# Altium footprint library mfmc_footprints.PcbLib: 156 footprints (part 1 of 10)
Each footprint in its own frame and in the unit in brackets; x right, y up, seen from the top. Pads: shape width x height; smd on the part's side, far side on the other; paste and mask are expansions set on the pad; w line width, h text height; cw(c..) or ccw(c..) is an arc to the next point about the centre after c.
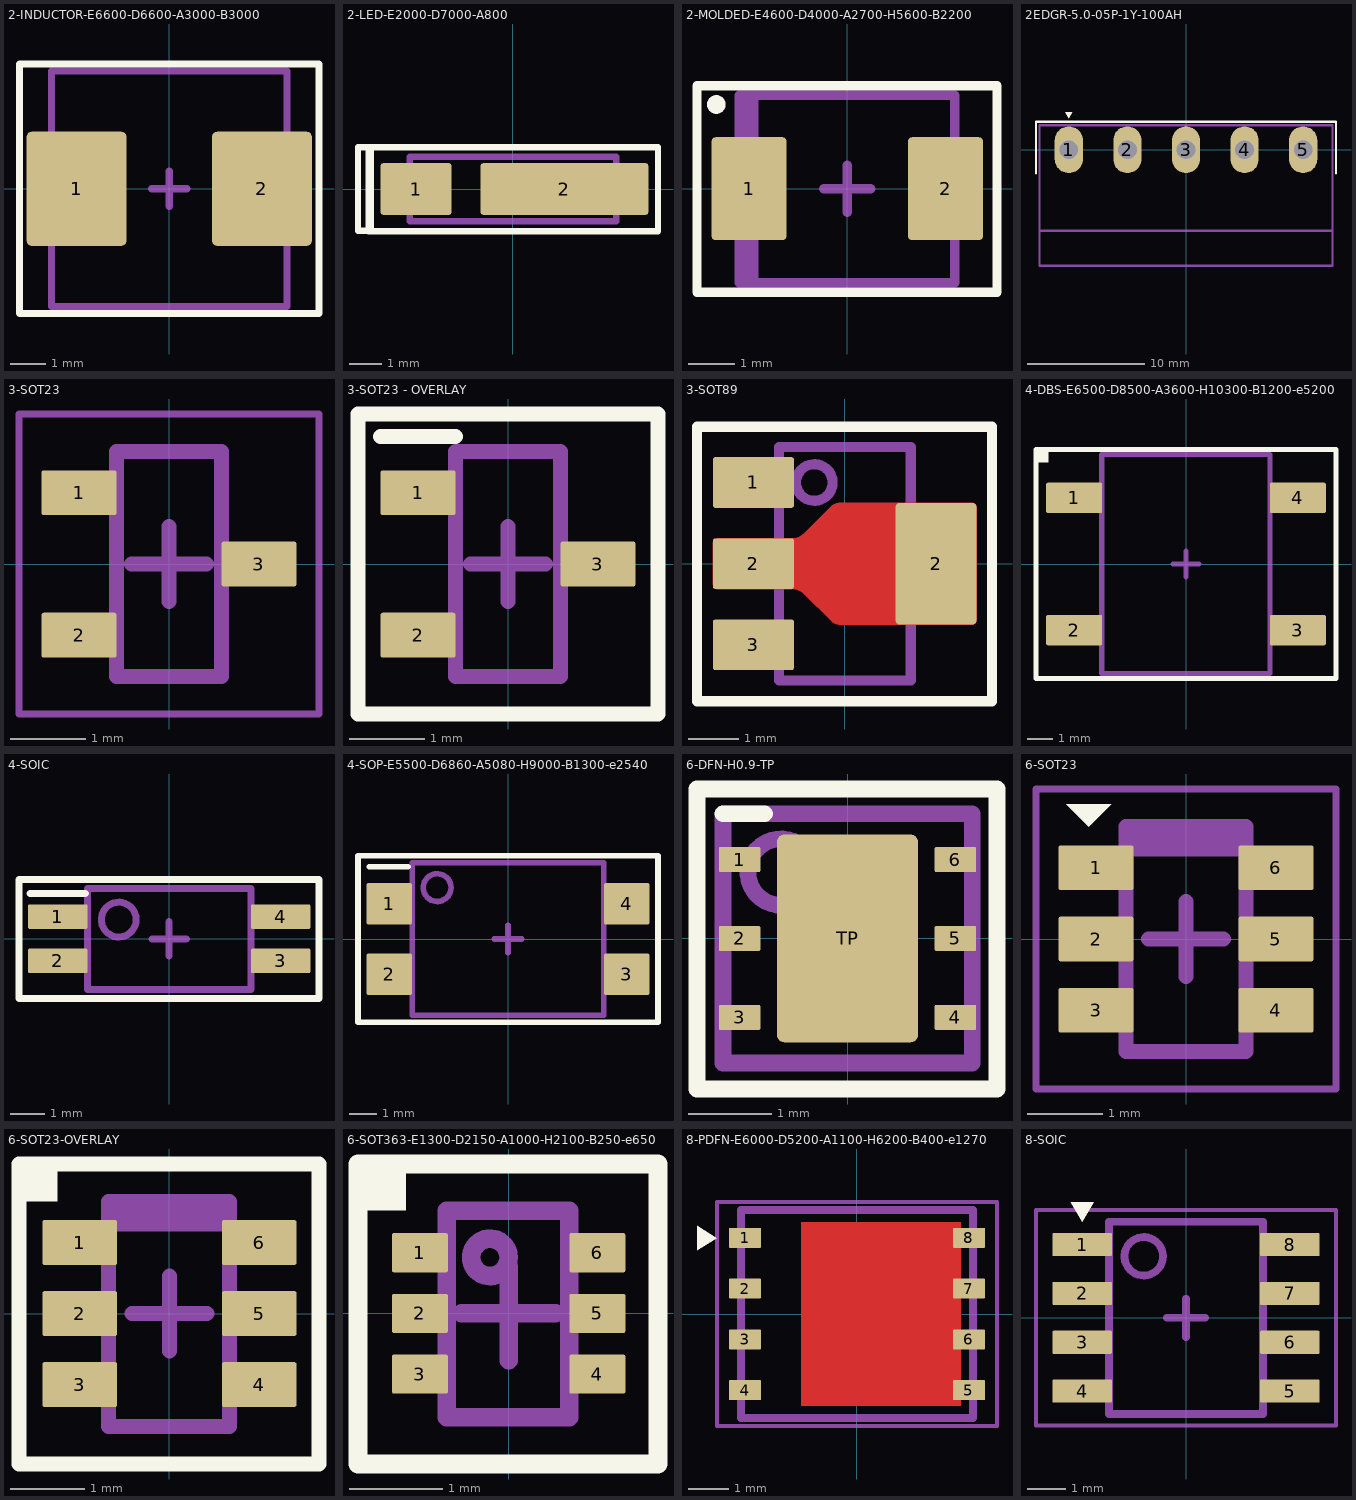
[diagram p0: the footprints below, top view; thin cyan lines are the x and y axes]

## 2-INDUCTOR-E6600-D6600-A3000-B3000 [mm]
height 3
pads (2):
  rrect10% 2.8x3.2 smd: 1(-2.6,0) 2(2.6,0)
Top Overlay:
  lines w0.2: -4.2,-3.5 -4.2,3.5 4.2,3.5 4.2,-3.5 -4.2,-3.5
Top Courtyard:
  lines w0.1: -4.213,-3.513 4.2,-3.513 4.2,3.5 -4.213,3.5 -4.213,-3.513
  lines w0.2: -0.5,0 0.5,0 ; 0,-0.5 0,0.5
Top Assembly:
  lines w0.2: -3.3,-3.3 -3.3,3.3 3.3,3.3 3.3,-3.3 -3.3,-3.3
Top Designator (Mech10):
  text ".Designator" at -7.618,-0.508 h1.52
3D body "User Library-L0603.step": height 2.95, standoff -0.05, extent -3.7,-3.3 3.7,3.3

## 2-LED-E2000-D7000-A800 [mm]
height 0.8
pads (2):
  rrect10% 2.2x1.6 smd: 1(-3,0)
  rrect10% 5.2x1.6 smd: 2(1.6,0)
Top Overlay:
  lines w0.2: -4.8,-1.3 -4.8,1.3 -4.4,1.3 -4.4,-1.3 -4.8,-1.3 ; -4.463,-1.313 4.5,-1.313 4.5,1.3 -4.463,1.3 -4.463,-1.313
Top Courtyard:
  lines w0.1: -3.2,-1 -3.2,1 3.2,1 3.2,-1 -3.2,-1
  lines w0.2: -0.5,0 0.5,0 ; 0,-0.5 0,0.5
Top Assembly:
  lines w0.2: -3.2,-1 -3.2,1 3.2,1 3.2,-1 -3.2,-1
Top Designator (Mech10):
  text ".Designator" at -7.768,-0.514 h1.52

## 2-MOLDED-E4600-D4000-A2700-H5600-B2200 [mm]
height 2.7
pads (2):
  rrect10% 1.6x2.2 smd: 1(-2.1,0) 2(2.1,0)
Top Overlay:
  circle w0.2: c-2.8,1.8 r0.1
  lines w0.2: -3.213,-2.213 3.2,-2.213 3.2,2.2 -3.213,2.2 -3.213,-2.213
Top Courtyard:
  lines w0.1: -3.213,-2.213 3.2,-2.213 3.2,2.2 -3.213,2.2 -3.213,-2.213
  lines w0.2: -0.5,0 0.5,0 ; 0,-0.5 0,0.5
Top Assembly:
  rectangle: -2.3,-2 -1.9,2
  lines w0.2: -2.313,-2.013 2.3,-2.013 2.3,2 -2.313,2 -2.313,-2.013
Top Designator (Mech10):
  text ".Designator" at -7.624,-0.514 h1.52
3D body "SMBJxx.STEP": height 2.7, standoff 0, extent -2.8,-2 2.8,2

## 2EDGR-5.0-05P-1Y-100AH [mm] "Pluggable Terminal Blocks PCB Socket"
height 8.6
pads (5):
  oval 2.4x4 hole 1.6: 1(-10,0) 2(-5,0) 3(0,0) 4(5,0) 5(10,0)
Top Overlay:
  region: -10,2.7 -10.3,3.2 -9.7,3.2
  lines w0.2: -12.8,-2 -12.8,2.4 12.8,2.4 12.8,-2
Top Courtyard:
  lines w0.1: -12.5,-9.9 12.5,-9.9 12.5,2.1 -12.5,2.1 -12.5,-9.9
  lines w0.2: -0.5,0 0.5,0 ; 0,-0.5 0,0.5
Top Assembly:
  lines w0.2: -12.5,-6.906 12.5,-6.906 ; -12.5,-9.9 -12.5,2.1 12.5,2.1 12.5,-9.9 -12.5,-9.9
Top Designator (Mech10):
  text ".Designator" at -7.618,-3.908 h1.52
3D body "2EDGR-5.0-05P-1Y-100AH.stp": height 8.61, standoff -3.09, extent -12.5,-9.9 12.5,2.1

## 3-SOT23 [mm] "SOT23, 3-Leads, Body 2,90x2,37mm, Pitch 0,95mm, IPC Medium Density"
height 1.1
pads (3):
  rrect10% 1x0.6 smd: 1(-1.2,0.95) 2(-1.2,-0.95) 3(1.2,0)
Top Courtyard:
  lines w0.1: -2,-2 -2,2 2,2 2,-2 -2,-2
  lines w0.2: -0.5,0 0.5,0 ; 0,-0.5 0,0.5
Top Assembly:
  lines w0.2: -0.7,-1.5 0.7,-1.5 0.7,1.5 -0.7,1.5 -0.7,-1.5
Top Designator (Mech10):
  text ".Designator" at -7.618,-0.508 h1.52
3D body "SOT95P237X110-3N.step": height 1.1, standoff 0, extent -1.32,-1.5 1.32,1.5

## 3-SOT23 - OVERLAY [mm] "SOT23, 3-Leads, Body 2,90x2,37mm, Pitch 0,95mm, IPC Medium Density"
height 1.1
pads (3):
  rrect10% 1x0.6 smd: 1(-1.2,0.95) 2(-1.2,-0.95) 3(1.2,0)
Top Overlay:
  lines w0.2: -1.7,1.7 -0.7,1.7 ; -2,-2 2,-2 2,2 -2,2 -2,-2
Top Courtyard:
  lines w0.1: -2,-2 -2,2 2,2 2,-2 -2,-2
  lines w0.2: -0.5,0 0.5,0 ; 0,-0.5 0,0.5
Top Assembly:
  lines w0.2: -0.7,-1.5 0.7,-1.5 0.7,1.5 -0.7,1.5 -0.7,-1.5
Top Designator (Mech10):
  text ".Designator" at -7.618,-0.508 h1.52
3D body "SOT95P237X110-3N.step": height 1.1, standoff 0, extent -1.32,-1.5 1.32,1.5

## 3-SOT89 [mm]
height 1.6
pads (4):
  rrect10% 1.6x1 smd: 1(-1.8,1.6) 2(-1.8,0) 3(-1.8,-1.6)
  rrect10% 1.6x2.4 smd: 2(1.8,0)
Top Layer:
  region: -2.5,0.5 -1.041,0.5 -1.008,0.502 -0.942,0.515 -0.88,0.54 -0.825,0.577 -0.8,0.6 -0.271,1.129 -0.254,1.146 -0.214,1.173 -0.17,1.191 -0.124,1.2 -0.1,1.2 2.5,1.2 2.52,1.2 2.557,1.185 2.585,1.157 2.6,1.12 2.6,1.1 2.6,-1.1 2.6,-1.12 2.585,-1.157 2.557,-1.185 2.52,-1.2 2.5,-1.2 -0.1,-1.2 -0.124,-1.2 -0.17,-1.191 -0.214,-1.173 -0.254,-1.146 -0.271,-1.129 -0.8,-0.6 -0.825,-0.577 -0.88,-0.54 -0.942,-0.515 -1.008,-0.502 -1.041,-0.5 -2.5,-0.5 -2.52,-0.5 -2.557,-0.485 -2.585,-0.457 -2.6,-0.42 -2.6,-0.4 -2.6,0.4 -2.6,0.42 -2.585,0.457 -2.557,0.485 -2.52,0.5
Top Overlay:
  lines w0.2: -2.913,-2.713 2.9,-2.713 2.9,2.7 -2.913,2.7 -2.913,-2.713
Top Courtyard:
  lines w0.1: -2.9,-2.7 -2.9,2.7 -0.3,2.7 0.3,2.7 2.9,2.7 2.9,-2.7 -2.9,-2.7
  lines w0.2: -0.5,0 0.5,0 ; 0,-0.5 0,0.5
Top Assembly:
  circle w0.2: c-0.6,1.6 r0.361
  lines w0.2: -1.3,-2.3 1.3,-2.3 1.3,2.3 -1.3,2.3 -1.3,-2.3
Top Designator (Mech10):
  text ".Designator" at -7.624,-0.514 h1.52
3D body "SOT-89.step": height 1.35, standoff 0, extent -2.1,-2.3 2.15,2.3

## 4-DBS-E6500-D8500-A3600-H10300-B1200-e5200 [mm]
height 3.6
pads (4):
  rrect10% 2.2x1.2 smd: 1(-4.4,2.6) 2(-4.4,-2.6) 3(4.4,-2.6) 4(4.4,2.6)
Top Overlay:
  rectangle: -5.9,4 -5.4,4.5
  lines w0.2: -5.9,-4.5 -5.9,4.5 5.9,4.5 5.9,-4.5 -5.9,-4.5
Top Courtyard:
  lines w0.1: -5.9,-4.5 -5.9,4.5 5.9,4.5 5.9,-4.5 -5.9,-4.5
  lines w0.2: -0.5,0 0.5,0 ; 0,-0.5 0,0.5
Top Assembly:
  lines w0.2: -3.313,-4.313 3.3,-4.313 3.3,4.3 -3.313,4.3 -3.313,-4.313
Top Designator (Mech10):
  text ".Designator" at -7.618,-0.508 h1.52
3D body "4-DBS.STEP": height 3.6, standoff 0, extent -5.15,-4.25 5.15,4.25

## 4-SOIC [mm] "SOIC, 4-Leads, Body 2,60x4,40mm, Pitch 1,27mm, IPC Medium Density"
height 2.1
pads (4):
  rrect10% 1.7x0.7 smd: 1(-3.2,0.635) 2(-3.2,-0.635) 3(3.2,-0.635) 4(3.2,0.635)
Top Overlay:
  lines w0.2: -4,1.3 -2.4,1.3 ; -4.313,-1.713 4.3,-1.713 4.3,1.7 -4.313,1.7 -4.313,-1.713
Top Courtyard:
  lines w0.1: -4.3,-1.7 -4.3,1.7 4.3,1.7 4.3,-1.7 -4.3,-1.7
  lines w0.2: -0.5,0 0.5,0 ; 0,-0.5 0,0.5
Top Assembly:
  circle w0.2: c-1.45,0.55 r0.5
  lines w0.2: -2.35,-1.45 -2.35,1.45 2.35,1.45 2.35,-1.45 -2.35,-1.45
Top Designator (Mech10):
  text ".Designator" at -7.624,-0.514 h1.52
3D body "SOIC127P700X210-4N.step": height 2.1, standoff 0, extent -3.5,-1.45 3.5,1.45

## 4-SOP-E5500-D6860-A5080-H9000-B1300-e2540 [mm]
height 5.08
pads (4):
  rrect10% 1.65x1.5 smd: 1(-4.275,1.27) 2(-4.275,-1.27) 3(4.275,-1.27) 4(4.275,1.27)
Top Overlay:
  lines w0.2: -5,2.6 -3.6,2.6 ; -5.4,-3 -5.4,3 5.4,3 5.4,-3 -5.4,-3
Top Courtyard:
  lines w0.1: -5.35,-3 -5.35,3 5.35,3 5.35,-3 -5.35,-3
  lines w0.2: -0.5,0 0.5,0 ; 0,-0.5 0,0.5
Top Assembly:
  circle w0.2: c-2.55,1.85 r0.5
  lines w0.2: -3.45,-2.75 -3.45,2.75 3.45,2.75 3.45,-2.75 -3.45,-2.75
Top Designator (Mech10):
  text ".Designator" at -7.618,-0.508 h1.52
3D body "SOP254P900X508-4N.step": height 5.08, standoff 0, extent -4.5,-2.75 4.5,2.75

## 6-DFN-H0.9-TP [mm]
height 0.9
pads (7):
  rrect10% 0.5x0.3 smd: 1(-1.3,0.95) 2(-1.3,0) 3(-1.3,-0.95) 4(1.3,-0.95) 5(1.3,0) 6(1.3,0.95)
  rrect10% 1.7x2.5 smd: TP(0,0)
Top Overlay:
  lines w0.2: -1.5,1.5 -1,1.5 ; -1.813,-1.813 1.8,-1.813 1.8,1.8 -1.813,1.8 -1.813,-1.813
Top Courtyard:
  lines w0.1: -1.8,-1.8 1.8,-1.8 1.8,1.8 -1.8,1.8 -1.8,-1.8
  lines w0.2: -0.5,0 0.5,0 ; 0,-0.5 0,0.5
Top Assembly:
  circle w0.2: c-0.8,0.8 r0.4
  lines w0.2: -1.5,-1.5 1.5,-1.5 1.5,1.5 -1.5,1.5 -1.5,-1.5
Top Designator (Mech10):
  text ".Designator" at -7.624,-0.514 h1.52
3D body "LDO40L.STEP": height 0.8, standoff 0, extent -1.5,-1.5 1.5,1.5

## 6-SOT23 [mm] "SOT23, 6-Leads, Body 2,90x2,37mm, Pitch 0,95mm, IPC Medium Density"
height 1.1
pads (6):
  rrect10% 1x0.6 smd: 1(-1.2,0.95) 2(-1.2,0) 3(-1.2,-0.95) 4(1.2,-0.95) 5(1.2,0) 6(1.2,0.95)
Top Overlay:
  region: -1.3,1.5 -1.6,1.8 -1,1.8
Top Courtyard:
  lines w0.1: -2,-2 -2,2 2,2 2,-2 -2,-2
  lines w0.2: -0.5,0 0.5,0 ; 0,-0.5 0,0.5
Top Assembly:
  rectangle: -0.8,1.1 0.8,1.5
  lines w0.2: -0.8,-1.5 -0.8,1.5 0.8,1.5 0.8,-1.5 -0.8,-1.5
Top Designator (Mech10):
  text ".Designator" at -7.618,-0.508 h1.52
3D body "User Library-SOT23-6-2.step": height 1.45, standoff 0, extent -1.4,-1.45 1.4,1.45

## 6-SOT23-OVERLAY [mm] "SOT23, 6-Leads, Body 2,90x2,37mm, Pitch 0,95mm, IPC Medium Density"
height 1.1
pads (6):
  rrect10% 1x0.6 smd: 1(-1.2,0.95) 2(-1.2,0) 3(-1.2,-0.95) 4(1.2,-0.95) 5(1.2,0) 6(1.2,0.95)
Top Overlay:
  rectangle: -2,1.5 -1.5,2
  lines w0.2: -2.013,-2.013 2,-2.013 2,2 -2.013,2 -2.013,-2.013
Top Courtyard:
  lines w0.1: -2.013,-2.013 2,-2.013 2,2 -2.013,2 -2.013,-2.013
  lines w0.2: -0.5,0 0.5,0 ; 0,-0.5 0,0.5
Top Assembly:
  rectangle: -0.8,1.1 0.8,1.5
  lines w0.2: -0.813,-1.513 0.8,-1.513 0.8,1.5 -0.813,1.5 -0.813,-1.513
Top Designator (Mech10):
  text ".Designator" at -7.624,-0.514 h1.52
3D body "User Library-SOT23-6-2.step": height 1.45, standoff 0, extent -1.4,-1.45 1.4,1.45

## 6-SOT363-E1300-D2150-A1000-H2100-B250-e650 [mm] "Surface Mount Package 6 leads height 1mm"
height 1
pads (6):
  rrect10% 0.6x0.42 smd: 1(-0.95,0.65) 2(-0.95,0) 3(-0.95,-0.65) 4(0.95,-0.65) 5(0.95,0) 6(0.95,0.65)
Top Overlay:
  rectangle: -1.6,1.1 -1.1,1.6
  lines w0.2: -1.613,-1.613 1.6,-1.613 1.6,1.6 -1.613,1.6 -1.613,-1.613
Top Courtyard:
  lines w0.1: -1.613,-1.613 1.6,-1.613 1.6,1.6 -1.613,1.6 -1.613,-1.613
  lines w0.2: -0.5,0 0.5,0 ; 0,-0.5 0,0.5
Top Assembly:
  circle w0.2: c-0.2,0.6 r0.2
  lines w0.2: -0.663,-1.113 0.65,-1.113 0.65,1.1 -0.663,1.1 -0.663,-1.113
Top Designator (Mech10):
  text ".Designator" at -7.624,-0.514 h1.52
3D body "User Library-SOT363-2.step": height 1.1, standoff 0, extent -1.2,-1.1 1.2,1.1

## 8-PDFN-E6000-D5200-A1100-H6200-B400-e1270 [mm] "PDFN5060-8L-B-1.1MM"
height 1.1
pads (8):
  rrect10% 0.8x0.5 smd: 1(-2.8,1.905) 2(-2.8,0.635) 3(-2.8,-0.635) 4(-2.8,-1.905) 5(2.8,-1.905) 6(2.8,-0.635) 7(2.8,0.635) 8(2.8,1.905)
Top Layer:
  rectangle: -1.4,-2.3 2.6,2.3
Top Overlay:
  region: -3.5,1.9 -4,2.2 -4,1.6
Top Courtyard:
  lines w0.1: -3.5,-2.8 3.5,-2.8 3.5,2.8 -3.5,2.8 -3.5,-2.8
  lines w0.2: -0.5,0 0.5,0 ; 0,-0.5 0,0.5
Top Assembly:
  circle w0.2: c1.5,0 r0.5
  lines w0.2: -2.9,-2.6 2.9,-2.6 2.9,2.6 -2.9,2.6 -2.9,-2.6
Top Designator (Mech10):
  text ".Designator" at -7.63,-0.521 h1.52
3D body "User Library-pdfn5x6.step": height 1.02, standoff 0, extent -3,-2.5 3,2.5

## 8-SOIC [mm] "SOIC, 8-Leads, Body 4,91x3,90mm, Pitch 1,27mm, IPC Medium Density"
height 1.75
pads (8):
  rrect10% 1.55x0.6 smd: 1(-2.7,1.905) 2(-2.7,0.635) 3(-2.7,-0.635) 4(-2.7,-1.905) 5(2.7,-1.905) 6(2.7,-0.635) 7(2.7,0.635) 8(2.7,1.905)
Top Overlay:
  region: -2.7,2.5 -3,3 -2.4,3
Top Courtyard:
  lines w0.1: -3.9,-2.8 3.9,-2.8 3.9,2.8 -3.9,2.8 -3.9,-2.8
  lines w0.2: -0.5,0 0.5,0 ; 0,-0.5 0,0.5
Top Assembly:
  circle w0.2: c-1.1,1.6 r0.5
  lines w0.2: -2,-2.5 -2,2.5 2,2.5 2,-2.5 -2,-2.5
Top Designator (Mech10):
  text ".Designator" at -7.618,-0.433 h1.52
3D body "SOIC127P600X175-8N.step": height 1.75, standoff 0, extent -2.997,-2.5 2.997,2.5